# Altium footprint library SOURIAU THD.PcbLib: 34 footprints (part 4 of 5) (continued)
## SOURIAU_UT07125P21E8T [mm] "Metal Circular Connector, 5 Male Contacts, Shell Size 12, UT07 Series"
height 31.7
pads (5):
  round 1.9 hole 1.2: 1(0,0) 2(4.211,0) 3(0,-4.211) 4(-4.211,0) 5(0,4.211)
Top Overlay:
  circle w0.2: c0,0 r14.835
  circle w0.2: c0,0 r13.029
  circle w0.2: c0,0 r9.479
  circle w0.2: c0,0 r6.677
  circle w0.2: c0,0 r1.65
  circle w0.2: c4.211,0 r1.65
  circle w0.2: c0,-4.211 r1.65
  circle w0.2: c-4.211,0 r1.65
  circle w0.2: c0,4.211 r1.65
  lines w0.2: -4.39,-6.393 ccw(c0,0) 3.807,-6.756 4.372,-7.574 ccw(c0,0) 5.598,-6.719 5.035,-5.889 ; -4.387,-6.389 -5.017,-7.163 cw(c0,0) -6.17,-6.197 -5.528,-5.438 cw(c0,0) -7.267,-2.707 -8.226,-2.969 cw(c0,0) -8.611,-1.527 -7.651,-1.265 cw(c0,0) -1.619,7.584 ; -3.887,-1.618 ccw(c0,0) -1.618,-3.887 ; -3.887,1.618 cw(c0,0) -1.618,3.887 ; -1.619,7.567 -1.619,8.594 cw(c0,0) 1.59,8.599 1.59,7.567 ; -1.001,-9.426 -1.001,-10.865 1.001,-10.865 1.001,-9.426 ; 1.59,7.59 cw(c0,0) 7.755,0.058 ; 1.618,-3.887 ccw(c0,0) 3.887,-1.618 ; 1.65,0 2.561,0 ; 5.039,-5.895 ccw(c0,0) 7.625,-1.416 ; 7.597,-1.413 8.615,-1.501 ccw(c0,0) 8.745,-0.029 7.744,0.059 ; 7.655,5.59 8.894,6.302 9.893,4.564 8.66,3.855 ; -9.921,4.563 -8.666,3.841 -9.921,4.563 ; -9.921,4.563 -8.922,6.301 ; -8.922,6.301 -7.664,5.578 -8.922,6.301 ; -15.9,-7.284 ccw(c0,0) -7.284,-15.9 7.284,-15.9 ccw(c0,0) 15.9,-7.284 15.9,7.284 ccw(c0,0) 7.284,15.9 -7.284,15.9 ccw(c0,0) -15.9,7.284 -15.9,-7.284 ; -13.014,-5.222 ccw(c0,0) -11.049,-8.635 -1.977,-13.883 ccw(c0,0) 1.977,-13.883 11.049,-8.635 ccw(c0,0) 13.014,-5.222 13.014,5.222 ccw(c0,0) 11.049,8.635 1.977,13.883 ccw(c0,0) -1.977,13.883 -11.049,8.635 ccw(c0,0) -13.014,5.222 -13.014,-5.222 ; -5.774,9.481 ccw(c0,0) 5.774,9.481 -5.774,9.481
  text "B5M" at -1.456,10.666 h1.25
  text "1" at 1.789,1.324 h1.2
  text "5" at -3.167,4.099 h1.2
  text "3" at -3.336,-5.226 h1.2
Mechanical 8:
  lines w0.1: -5.211,0 -4.211,0 ; -4.211,-1 -4.211,0 ; -4.211,1 -4.211,0 ; -3.211,0 -4.211,0 ; -1,-4.211 0,-4.211 ; -1,0 0,0 ; -1,4.211 0,4.211 ; 0,-5.211 0,-4.211 ; 0,-3.211 0,-4.211 ; 0,-1 0,0 ; 0,1 0,0 ; 0,3.211 0,4.211 ; 0,5.211 0,4.211 ; 1,-4.211 0,-4.211 ; 1,0 0,0 ; 1,4.211 0,4.211 ; 3.211,0 4.211,0 ; 4.211,-1 4.211,0 ; 4.211,1 4.211,0 ; 5.211,0 4.211,0
Mechanical 14:
  circle w0.1: c0,0 r14.835
  circle w0.1: c0,0 r13.029
  circle w0.1: c0,0 r9.479
  circle w0.1: c0,0 r6.677
  circle w0.1: c0,0 r1.65
  circle w0.1: c4.211,0 r1.65
  circle w0.1: c0,-4.211 r1.65
  circle w0.1: c-4.211,0 r1.65
  circle w0.1: c0,4.211 r1.65
  lines w0.1: -4.39,-6.393 ccw(c0,0) 3.807,-6.756 4.372,-7.574 ccw(c0,0) 5.598,-6.719 5.035,-5.889 ; -4.387,-6.389 -5.017,-7.163 cw(c0,0) -6.17,-6.197 -5.528,-5.438 cw(c0,0) -7.267,-2.707 -8.226,-2.969 cw(c0,0) -8.611,-1.527 -7.651,-1.265 cw(c0,0) -1.619,7.584 ; -3.887,-1.618 ccw(c0,0) -1.618,-3.887 ; -3.887,1.618 cw(c0,0) -1.618,3.887 ; -1.619,7.567 -1.619,8.594 cw(c0,0) 1.59,8.599 1.59,7.567 ; -1.001,-9.426 -1.001,-10.865 1.001,-10.865 1.001,-9.426 ; 1.59,7.59 cw(c0,0) 7.755,0.058 ; 1.618,-3.887 ccw(c0,0) 3.887,-1.618 ; 1.65,0 2.561,0 ; 5.039,-5.895 ccw(c0,0) 7.625,-1.416 ; 7.597,-1.413 8.615,-1.501 ccw(c0,0) 8.745,-0.029 7.744,0.059 ; 7.655,5.59 8.894,6.302 9.893,4.564 8.66,3.855 ; -9.921,4.563 -8.666,3.841 -9.921,4.563 ; -9.921,4.563 -8.922,6.301 ; -8.922,6.301 -7.664,5.578 -8.922,6.301 ; -15.9,-7.284 ccw(c0,0) -7.284,-15.9 7.284,-15.9 ccw(c0,0) 15.9,-7.284 15.9,7.284 ccw(c0,0) 7.284,15.9 -7.284,15.9 ccw(c0,0) -15.9,7.284 -15.9,-7.284 ; -13.014,-5.222 ccw(c0,0) -11.049,-8.635 -1.977,-13.883 ccw(c0,0) 1.977,-13.883 11.049,-8.635 ccw(c0,0) 13.014,-5.222 13.014,5.222 ccw(c0,0) 11.049,8.635 1.977,13.883 ccw(c0,0) -1.977,13.883 -11.049,8.635 ccw(c0,0) -13.014,5.222 -13.014,-5.222 ; -5.774,9.481 ccw(c0,0) 5.774,9.481 -5.774,9.481
  text "B5M" at -1.456,10.666 h1.25
  text "1" at 1.789,1.324 h1.2
  text "5" at -3.167,4.099 h1.2
  text "3" at -3.336,-5.226 h1.2
3D body "SOURIAU_UT07125P21E8T.stp": height 31.35, standoff -3.6, extent -15.875,-15.875 15.875,15.875
3D body "SOURIAU_UT07125P21E8T_NUT.stp": height 19.35, standoff 15.92, extent -13,-14 13,14

## SOURIAU_UT07125S21E84T [mm] "Metal Circular Connector, 5 Female Contacts, Shell Size 12, UT07 Series"
height 31.7
pads (5):
  round 1.9 hole 1.2: 1(0,0) 2(-4.211,0) 3(0,-4.211) 4(4.211,0) 5(0,4.211)
Top Overlay:
  circle w0.2: c0,0 r14.835
  circle w0.2: c0,0 r13.029
  circle w0.2: c0,0 r9.479
  circle w0.2: c0,0 r6.677
  circle w0.2: c0,0 r1.65
  circle w0.2: c4.211,0 r1.65
  circle w0.2: c0,-4.211 r1.65
  circle w0.2: c-4.211,0 r1.65
  circle w0.2: c0,4.211 r1.65
  lines w0.2: -4.39,-6.393 ccw(c0,0) 3.807,-6.756 4.372,-7.574 ccw(c0,0) 5.598,-6.719 5.035,-5.889 ; -4.387,-6.389 -5.017,-7.163 cw(c0,0) -6.17,-6.197 -5.528,-5.438 cw(c0,0) -7.267,-2.707 -8.226,-2.969 cw(c0,0) -8.611,-1.527 -7.651,-1.265 cw(c0,0) -1.619,7.584 ; -3.887,-1.618 ccw(c0,0) -1.618,-3.887 ; -2.561,0 -1.65,0 ; -1.619,7.567 -1.619,8.594 cw(c0,0) 1.59,8.599 1.59,7.567 ; -1.001,-9.426 -1.001,-10.865 1.001,-10.865 1.001,-9.426 ; 1.59,7.59 cw(c0,0) 7.755,0.058 ; 1.618,-3.887 ccw(c0,0) 3.887,-1.618 ; 1.618,3.887 cw(c0,0) 3.887,1.618 ; 5.039,-5.895 ccw(c0,0) 7.625,-1.416 ; 7.597,-1.413 8.615,-1.501 ccw(c0,0) 8.745,-0.029 7.744,0.059 ; 7.655,5.59 8.894,6.302 9.893,4.564 8.66,3.855 ; -9.921,4.563 -8.666,3.841 -9.921,4.563 ; -9.921,4.563 -8.922,6.301 ; -8.922,6.301 -7.664,5.578 -8.922,6.301 ; -15.9,-7.284 ccw(c0,0) -7.284,-15.9 7.284,-15.9 ccw(c0,0) 15.9,-7.284 15.9,7.284 ccw(c0,0) 7.284,15.9 -7.284,15.9 ccw(c0,0) -15.9,7.284 -15.9,-7.284 ; -13.014,-5.222 ccw(c0,0) -11.049,-8.635 -1.977,-13.883 ccw(c0,0) 1.977,-13.883 11.049,-8.635 ccw(c0,0) 13.014,-5.222 13.014,5.222 ccw(c0,0) 11.049,8.635 1.977,13.883 ccw(c0,0) -1.977,13.883 -11.049,8.635 ccw(c0,0) -13.014,5.222 -13.014,-5.222 ; -5.774,9.481 ccw(c0,0) 5.774,9.481 -5.774,9.481
  text "B5F" at -1.456,10.666 h1.25
  text "1" at 1.789,1.324 h1.2
  text "5" at -3.167,4.099 h1.2
  text "3" at -3.336,-5.226 h1.2
Mechanical 8:
  lines w0.1: -5.211,0 -4.211,0 ; -4.211,-1 -4.211,0 ; -4.211,1 -4.211,0 ; -3.211,0 -4.211,0 ; -1,-4.211 0,-4.211 ; -1,0 0,0 ; -1,4.211 0,4.211 ; 0,-5.211 0,-4.211 ; 0,-3.211 0,-4.211 ; 0,-1 0,0 ; 0,1 0,0 ; 0,3.211 0,4.211 ; 0,5.211 0,4.211 ; 1,-4.211 0,-4.211 ; 1,0 0,0 ; 1,4.211 0,4.211 ; 3.211,0 4.211,0 ; 4.211,-1 4.211,0 ; 4.211,1 4.211,0 ; 5.211,0 4.211,0
Mechanical 14:
  circle w0.1: c0,0 r14.835
  circle w0.1: c0,0 r13.029
  circle w0.1: c0,0 r9.479
  circle w0.1: c0,0 r6.677
  circle w0.1: c0,0 r1.65
  circle w0.1: c4.211,0 r1.65
  circle w0.1: c0,-4.211 r1.65
  circle w0.1: c-4.211,0 r1.65
  circle w0.1: c0,4.211 r1.65
  lines w0.1: -4.39,-6.393 ccw(c0,0) 3.807,-6.756 4.372,-7.574 ccw(c0,0) 5.598,-6.719 5.035,-5.889 ; -4.387,-6.389 -5.017,-7.163 cw(c0,0) -6.17,-6.197 -5.528,-5.438 cw(c0,0) -7.267,-2.707 -8.226,-2.969 cw(c0,0) -8.611,-1.527 -7.651,-1.265 cw(c0,0) -1.619,7.584 ; -3.887,-1.618 ccw(c0,0) -1.618,-3.887 ; -2.561,0 -1.65,0 ; -1.619,7.567 -1.619,8.594 cw(c0,0) 1.59,8.599 1.59,7.567 ; -1.001,-9.426 -1.001,-10.865 1.001,-10.865 1.001,-9.426 ; 1.59,7.59 cw(c0,0) 7.755,0.058 ; 1.618,-3.887 ccw(c0,0) 3.887,-1.618 ; 1.618,3.887 cw(c0,0) 3.887,1.618 ; 5.039,-5.895 ccw(c0,0) 7.625,-1.416 ; 7.597,-1.413 8.615,-1.501 ccw(c0,0) 8.745,-0.029 7.744,0.059 ; 7.655,5.59 8.894,6.302 9.893,4.564 8.66,3.855 ; -9.921,4.563 -8.666,3.841 -9.921,4.563 ; -9.921,4.563 -8.922,6.301 ; -8.922,6.301 -7.664,5.578 -8.922,6.301 ; -15.9,-7.284 ccw(c0,0) -7.284,-15.9 7.284,-15.9 ccw(c0,0) 15.9,-7.284 15.9,7.284 ccw(c0,0) 7.284,15.9 -7.284,15.9 ccw(c0,0) -15.9,7.284 -15.9,-7.284 ; -13.014,-5.222 ccw(c0,0) -11.049,-8.635 -1.977,-13.883 ccw(c0,0) 1.977,-13.883 11.049,-8.635 ccw(c0,0) 13.014,-5.222 13.014,5.222 ccw(c0,0) 11.049,8.635 1.977,13.883 ccw(c0,0) -1.977,13.883 -11.049,8.635 ccw(c0,0) -13.014,5.222 -13.014,-5.222 ; -5.774,9.481 ccw(c0,0) 5.774,9.481 -5.774,9.481
  text "B5F" at -1.456,10.666 h1.2
  text "1" at 1.789,1.324 h1.2
  text "5" at -3.167,4.099 h1.2
  text "3" at -3.336,-5.226 h1.2
3D body "SOURIAU_UT07125S21E84T.stp": height 23.75, standoff -3.6, extent -15.875,-15.875 15.875,15.875
3D body "SOURIAU_UT07125S21E84T_NUT.stp": height 11.75, standoff 8.32, extent -13,-14 13,14

## SOURIAU_UT07128P21E8T [mm] "Metal Circular Connector, 8 Male Contacts, Shell Size 12, UT07 Series"
height 31.7
pads (8):
  round 1.9 hole 1.2: 1(0,0) 2(4.476,0.913) 3(3.474,-2.827) 4(0,-4.505) 5(-3.445,-2.827) 6(-4.446,0.913) 7(-2.002,4.034) 8(2.002,4.034)
Top Overlay:
  circle w0.2: c2.002,4.034 r1.65
  circle w0.2: c-3.445,-2.827 r1.65
  circle w0.2: c0,0 r1.65
  circle w0.2: c0,0 r6.69
  circle w0.2: c0,0 r9.519
  circle w0.2: c0,0 r13.024
  circle w0.2: c0,0 r14.837
  lines w0.2: -13.065,-5.071 ccw(c0,0) -10.97,-8.721 ; -13.065,5.071 cw(c0,0) -10.959,8.735 ; -13.014,-5.06 -13.014,5.082 ; -10.92,-8.71 -2.04,-13.847 ; -10.909,8.746 -2.057,13.866 ; -8.684,3.898 -9.893,4.593 -8.892,6.301 -7.69,5.61 ; -5.706,9.5 ccw(c0,0) 5.706,9.5 ; -5.655,9.511 5.756,9.511 ; -4.454,-0.748 ccw(c0,0) -4.296,-1.395 ; -3.821,2.407 cw(c0,0) -3.361,3.017 ; -2.248,-3.917 ccw(c0,0) -1.669,-4.197 ; -2.108,13.855 cw(c0,0) 1.973,13.875 ; -2.09,-13.858 ccw(c0,0) 1.956,-13.877 ; -1.001,-9.466 -1.001,-10.865 1.001,-10.865 1.001,-9.466 ; -0.47,4.492 cw(c0,0) 0.373,4.501 ; 1.575,-4.233 ccw(c0,0) 2.2,-3.944 ; 1.617,0.33 2.859,0.583 ; 2.006,-13.866 11.08,-8.635 ; 2.023,13.886 11.069,8.67 ; 4.284,-1.429 ccw(c0,0) 4.454,-0.748 ; 7.699,5.598 8.922,6.301 9.923,4.593 8.69,3.885 ; 11.019,8.659 cw(c0,0) 12.994,5.25 ; 11.03,-8.646 ccw(c0,0) 12.994,-5.25 ; 13.044,-5.239 13.044,5.261 ; -15.9,-7.273 ccw(c0,0) -7.273,-15.9 7.273,-15.9 ccw(c0,0) 15.9,-7.273 15.9,7.273 ccw(c0,0) 7.273,15.9 ; -15.9,-7.273 -15.9,7.273 ; -15.9,-7.273 -15.9,7.273 ; -15.9,7.273 cw(c0,0) -7.273,15.9 ; -7.273,15.9 7.273,15.9 ; -7.273,15.9 7.273,15.9 ; -8.65,-1.516 ccw(c0,0) -8.258,-2.986 -7.272,-2.717 ccw(c0,0) -5.547,-5.431 -6.207,-6.212 ccw(c0,0) -5.056,-7.18 -4.392,-6.401 ccw(c0,0) 3.833,-6.75 4.428,-7.583 ccw(c0,0) 5.65,-6.723 5.075,-5.874 ccw(c0,0) 7.633,-1.414 8.652,-1.504 ccw(c0,0) 8.782,-0.001 7.762,0.089 ccw(c0,0) 1.619,7.592 1.619,8.631 ccw(c0,0) -1.59,8.636 -1.59,7.598 ccw(c0,0) -7.662,-1.246 -8.65,-1.516
  text "B8M" at -1.456,10.666 h1.2
  text "5" at -6.094,-1.432 h1.2
  text "8" at -0.74,4.982 h1.2
  text "1" at -0.584,2.182 h1.2
Mechanical 8:
  lines w0.1: -5.446,0.913 -4.446,0.913 ; -4.446,-0.087 -4.446,0.913 ; -4.446,1.913 -4.446,0.913 ; -4.445,-2.827 -3.445,-2.827 ; -3.445,-3.827 -3.445,-2.827 ; -3.445,-1.827 -3.445,-2.827 ; -3.446,0.913 -4.446,0.913 ; -3.002,4.034 -2.002,4.034 ; -2.445,-2.827 -3.445,-2.827 ; -2.002,3.034 -2.002,4.034 ; -2.002,5.034 -2.002,4.034 ; -1.002,4.034 -2.002,4.034 ; -1,-4.505 0,-4.505 ; -1,0 0,0 ; 0,-5.505 0,-4.505 ; 0,-3.505 0,-4.505 ; 0,-1 0,0 ; 0,1 0,0 ; 1,-4.505 0,-4.505 ; 1,0 0,0 ; 1.002,4.034 2.002,4.034 ; 2.002,3.034 2.002,4.034 ; 2.002,5.034 2.002,4.034 ; 2.474,-2.827 3.474,-2.827 ; 3.002,4.034 2.002,4.034 ; 3.474,-3.827 3.474,-2.827 ; 3.474,-1.827 3.474,-2.827 ; 3.476,0.913 4.476,0.913 ; 4.474,-2.827 3.474,-2.827 ; 4.476,-0.087 4.476,0.913 ; 4.476,1.913 4.476,0.913 ; 5.476,0.913 4.476,0.913
Mechanical 14:
  circle w0.1: c0,0 r14.837
  circle w0.1: c0,0 r13.024
  circle w0.1: c0,0 r9.519
  circle w0.1: c0,0 r6.69
  circle w0.1: c0,0 r1.65
  circle w0.1: c-3.445,-2.827 r1.65
  circle w0.1: c2.002,4.034 r1.65
  lines w0.1: -13.065,-5.071 ccw(c0,0) -10.97,-8.721 ; -13.065,5.071 cw(c0,0) -10.959,8.735 ; -13.014,-5.06 -13.014,5.082 ; -10.92,-8.71 -2.04,-13.847 ; -10.909,8.746 -2.057,13.866 ; -8.684,3.898 -9.893,4.593 -8.892,6.301 -7.69,5.61 ; -5.706,9.5 ccw(c0,0) 5.706,9.5 ; -5.655,9.511 5.756,9.511 ; -4.454,-0.748 ccw(c0,0) -4.296,-1.395 ; -3.821,2.407 cw(c0,0) -3.361,3.017 ; -2.248,-3.917 ccw(c0,0) -1.669,-4.197 ; -2.108,13.855 cw(c0,0) 1.973,13.875 ; -2.09,-13.858 ccw(c0,0) 1.956,-13.877 ; -1.001,-9.466 -1.001,-10.865 1.001,-10.865 1.001,-9.466 ; -0.47,4.492 cw(c0,0) 0.373,4.501 ; 1.575,-4.233 ccw(c0,0) 2.2,-3.944 ; 1.617,0.33 2.859,0.583 ; 2.006,-13.866 11.08,-8.635 ; 2.023,13.886 11.069,8.67 ; 4.284,-1.429 ccw(c0,0) 4.454,-0.748 ; 7.699,5.598 8.922,6.301 9.923,4.593 8.69,3.885 ; 11.019,8.659 cw(c0,0) 12.994,5.25 ; 11.03,-8.646 ccw(c0,0) 12.994,-5.25 ; 13.044,-5.239 13.044,5.261 ; -15.9,-7.273 ccw(c0,0) -7.273,-15.9 7.273,-15.9 ccw(c0,0) 15.9,-7.273 15.9,7.273 ccw(c0,0) 7.273,15.9 ; -15.9,-7.273 -15.9,7.273 ; -15.9,-7.273 -15.9,7.273 ; -15.9,7.273 cw(c0,0) -7.273,15.9 ; -7.273,15.9 7.273,15.9 ; -7.273,15.9 7.273,15.9 ; -8.65,-1.516 ccw(c0,0) -8.258,-2.986 -7.272,-2.717 ccw(c0,0) -5.547,-5.431 -6.207,-6.212 ccw(c0,0) -5.056,-7.18 -4.392,-6.401 ccw(c0,0) 3.833,-6.75 4.428,-7.583 ccw(c0,0) 5.65,-6.723 5.075,-5.874 ccw(c0,0) 7.633,-1.414 8.652,-1.504 ccw(c0,0) 8.782,-0.001 7.762,0.089 ccw(c0,0) 1.619,7.592 1.619,8.631 ccw(c0,0) -1.59,8.636 -1.59,7.598 ccw(c0,0) -7.662,-1.246 -8.65,-1.516
  text "B8M" at -1.456,10.666 h1.2
  text "5" at -6.121,-1.459 h1.2
  text "8" at -0.74,4.982 h1.2
  text "1" at -0.584,2.182 h1.2
3D body "SOURIAU_UT07128P21E8T_NUT.stp": height 19.35, standoff 15.92, extent -13,-14 13,14
3D body "SOURIAU_UT07128P21E8T.stp": height 31.35, standoff -3.6, extent -15.875,-15.875 15.875,15.875

## SOURIAU_UT07128S21E84T [mm] "Metal Circular Connector, 8 Male Contacts, Shell Size 12, UT07 Series"
height 31.7
pads (8):
  round 1.9 hole 1.2: 1(0,0) 2(-4.446,0.913) 3(-3.445,-2.827) 4(0,-4.505) 5(3.474,-2.827) 6(4.476,0.913) 7(2.002,4.034) 8(-2.002,4.034)
Top Overlay:
  circle w0.2: c0,0 r6.69
  circle w0.2: c0,0 r9.519
  circle w0.2: c0,0 r13.024
  circle w0.2: c0,0 r14.837
  circle w0.2: c-2.002,4.034 r1.65
  circle w0.2: c3.474,-2.827 r1.65
  circle w0.2: c0,0 r1.65
  lines w0.2: -13.065,-5.071 ccw(c0,0) -10.97,-8.721 ; -13.065,5.071 cw(c0,0) -10.959,8.735 ; -13.014,-5.06 -13.014,5.082 ; -10.92,-8.71 -2.04,-13.847 ; -10.909,8.746 -2.057,13.866 ; -8.684,3.898 -9.893,4.593 -8.892,6.301 -7.69,5.61 ; -5.706,9.5 ccw(c0,0) 5.706,9.5 ; -5.655,9.511 5.756,9.511 ; -4.418,-0.737 ccw(c0,0) -4.258,-1.391 ; -2.83,0.581 -1.616,0.332 ; -2.195,-3.904 ccw(c0,0) -1.617,-4.177 ; -2.108,13.855 cw(c0,0) 1.973,13.875 ; -2.09,-13.858 ccw(c0,0) 1.956,-13.877 ; -1.001,-9.466 -1.001,-10.865 1.001,-10.865 1.001,-9.466 ; -0.408,4.46 cw(c0,0) 0.408,4.46 ; 1.617,-4.177 ccw(c0,0) 2.215,-3.893 ; 2.006,-13.866 11.08,-8.635 ; 2.023,13.886 11.069,8.67 ; 3.306,3.022 cw(c0,0) 3.777,2.408 ; 4.262,-1.377 ccw(c0,0) 4.418,-0.736 ; 7.699,5.598 8.922,6.301 9.923,4.593 8.69,3.885 ; 11.019,8.659 cw(c0,0) 12.994,5.25 ; 11.03,-8.646 ccw(c0,0) 12.994,-5.25 ; 13.044,-5.239 13.044,5.261 ; -15.9,-7.273 ccw(c0,0) -7.273,-15.9 7.273,-15.9 ccw(c0,0) 15.9,-7.273 15.9,7.273 ccw(c0,0) 7.273,15.9 ; -15.9,-7.273 -15.9,7.273 ; -15.9,-7.273 -15.9,7.273 ; -15.9,7.273 cw(c0,0) -7.273,15.9 ; -7.273,15.9 7.273,15.9 ; -7.273,15.9 7.273,15.9 ; -3.327,4.976 -3.239,5.094 ; -3.327,4.976 -3.239,5.094 ; -3.327,4.976 -3.239,5.094 ; -8.65,-1.516 ccw(c0,0) -8.258,-2.986 -7.272,-2.717 ccw(c0,0) -5.547,-5.431 -6.207,-6.212 ccw(c0,0) -5.056,-7.18 -4.392,-6.401 ccw(c0,0) 3.833,-6.75 4.428,-7.583 ccw(c0,0) 5.65,-6.723 5.075,-5.874 ccw(c0,0) 7.633,-1.414 8.652,-1.504 ccw(c0,0) 8.782,-0.001 7.762,0.089 ccw(c0,0) 1.619,7.592 1.619,8.631 ccw(c0,0) -1.59,8.636 -1.59,7.598 ccw(c0,0) -7.662,-1.246 -8.65,-1.516 ; -0.618,4.947 -0.501,4.711 -0.618,4.947
  text "B8F" at -1.456,10.666 h1.2
  text "5" at 5.184,-1.557 h1.2
  text "8" at 0.012,4.917 h1.2
  text "1" at 2.039,0.962 h1.2
Mechanical 8:
  lines w0.1: -5.446,0.913 -4.446,0.913 ; -4.446,-0.087 -4.446,0.913 ; -4.446,1.913 -4.446,0.913 ; -4.445,-2.827 -3.445,-2.827 ; -3.445,-3.827 -3.445,-2.827 ; -3.445,-1.827 -3.445,-2.827 ; -3.446,0.913 -4.446,0.913 ; -3.002,4.034 -2.002,4.034 ; -2.445,-2.827 -3.445,-2.827 ; -2.002,3.034 -2.002,4.034 ; -2.002,5.034 -2.002,4.034 ; -1.002,4.034 -2.002,4.034 ; -1,-4.505 0,-4.505 ; 0,-5.505 0,-4.505 ; 0,-3.505 0,-4.505 ; 0,1 0,0 ; 1,-4.505 0,-4.505 ; 1,0 0,0 ; 1.002,4.034 2.002,4.034 ; 2.002,3.034 2.002,4.034 ; 2.002,5.034 2.002,4.034 ; 2.474,-2.827 3.474,-2.827 ; 3.002,4.034 2.002,4.034 ; 3.474,-3.827 3.474,-2.827 ; 3.474,-1.827 3.474,-2.827 ; 3.476,0.913 4.476,0.913 ; 4.474,-2.827 3.474,-2.827 ; 4.476,-0.087 4.476,0.913 ; 4.476,1.913 4.476,0.913 ; 5.476,0.913 4.476,0.913 ; 0,0 0,-1 0,0 ; 0,0 -1,0 0,0
Mechanical 14:
  circle w0.1: c0,0 r14.837
  circle w0.1: c0,0 r13.024
  circle w0.1: c0,0 r9.519
  circle w0.1: c0,0 r6.69
  circle w0.1: c-2.002,4.034 r1.65
  circle w0.1: c3.474,-2.827 r1.65
  circle w0.1: c0,0 r1.65
  lines w0.1: -13.065,-5.071 ccw(c0,0) -10.97,-8.721 ; -13.065,5.071 cw(c0,0) -10.959,8.735 ; -13.014,-5.06 -13.014,5.082 ; -10.92,-8.71 -2.04,-13.847 ; -10.909,8.746 -2.057,13.866 ; -8.684,3.898 -9.893,4.593 -8.892,6.301 -7.69,5.61 ; -5.706,9.5 ccw(c0,0) 5.706,9.5 ; -5.655,9.511 5.756,9.511 ; -4.418,-0.737 ccw(c0,0) -4.258,-1.391 ; -2.83,0.581 -1.616,0.332 ; -2.195,-3.904 ccw(c0,0) -1.617,-4.177 ; -2.108,13.855 cw(c0,0) 1.973,13.875 ; -2.09,-13.858 ccw(c0,0) 1.956,-13.877 ; -1.001,-9.466 -1.001,-10.865 1.001,-10.865 1.001,-9.466 ; -0.408,4.46 cw(c0,0) 0.408,4.46 ; 1.617,-4.177 ccw(c0,0) 2.215,-3.893 ; 2.006,-13.866 11.08,-8.635 ; 2.023,13.886 11.069,8.67 ; 3.306,3.022 cw(c0,0) 3.777,2.408 ; 4.262,-1.377 ccw(c0,0) 4.418,-0.736 ; 7.699,5.598 8.922,6.301 9.923,4.593 8.69,3.885 ; 11.019,8.659 cw(c0,0) 12.994,5.25 ; 11.03,-8.646 ccw(c0,0) 12.994,-5.25 ; 13.044,-5.239 13.044,5.261 ; -15.9,-7.273 ccw(c0,0) -7.273,-15.9 7.273,-15.9 ccw(c0,0) 15.9,-7.273 15.9,7.273 ccw(c0,0) 7.273,15.9 ; -15.9,-7.273 -15.9,7.273 ; -15.9,-7.273 -15.9,7.273 ; -15.9,7.273 cw(c0,0) -7.273,15.9 ; -7.273,15.9 7.273,15.9 ; -7.273,15.9 7.273,15.9 ; -3.327,4.976 -3.239,5.094 ; -3.327,4.976 -3.239,5.094 ; -3.327,4.976 -3.239,5.094 ; -8.65,-1.516 ccw(c0,0) -8.258,-2.986 -7.272,-2.717 ccw(c0,0) -5.547,-5.431 -6.207,-6.212 ccw(c0,0) -5.056,-7.18 -4.392,-6.401 ccw(c0,0) 3.833,-6.75 4.428,-7.583 ccw(c0,0) 5.65,-6.723 5.075,-5.874 ccw(c0,0) 7.633,-1.414 8.652,-1.504 ccw(c0,0) 8.782,-0.001 7.762,0.089 ccw(c0,0) 1.619,7.592 1.619,8.631 ccw(c0,0) -1.59,8.636 -1.59,7.598 ccw(c0,0) -7.662,-1.246 -8.65,-1.516 ; -0.618,4.947 -0.501,4.711 -0.618,4.947
  text "B8F" at -1.456,10.666 h1.2
  text "5" at 5.184,-1.557 h1.2
  text "8" at 0.012,4.917 h1.2
  text "1" at 2.039,0.962 h1.2
3D body "SOURIAU_UT07128S21E84T.stp": height 23.75, standoff -3.6, extent -15.875,-15.875 15.875,15.875
3D body "SOURIAU_UT07128S21E84T_NUT.stp": height 11.75, standoff 8.32, extent -13,-14 13,14

## SOURIAU_UT071412P21E8T [mm] "Metal Circular Connector, 12 Male Contacts, Shell Size 14, UT07 Series"
height 31.7
pads (12):
  round 1.9 hole 1.2: 1(1.478,1.762) 2(0.787,-2.161) 3(-2.265,0.399) 4(-5.153,2.975) 5(-2.035,5.591) 6(2.035,5.591) 7(5.153,2.975) 8(5.86,-1.033) 9(3.825,-4.558) 10(0,-5.95) 11(-3.825,-4.558) 12(-5.86,-1.033)
Top Overlay:
  circle w0.2: c0,0 r15
  circle w0.2: c0,0 r16.45
  circle w0.2: c0,0 r11.1
  lines w0.2: -10.074,4.661 -11.412,5.434 -10.412,7.166 -9.074,6.393 ; -7.485,-1.32 ccw(c-5.86,-1.033) -6.146,0.592 ; -5.035,-2.462 -4.65,-3.129 ; -3.921,1.877 -3.496,1.498 ; -3.889,4.036 -3.299,4.531 ; -3.53,6.288 ccw(c-2.035,5.591) -1.338,7.087 ; -2.274,-5.122 -1.55,-5.386 ; -1.167,-7.117 cw(c0,-5.95) 1.167,-7.117 ; -1.001,-0.661 -0.477,-1.101 ; -1,-11.055 -1,-12.6 1,-12.6 1,-11.055 ; -0.385,5.591 0.385,5.591 ; -0.172,1.772 ccw(c1.478,1.762) 1.454,3.412 ; 1.073,-0.536 1.192,0.137 ; 1.55,-5.386 2.274,-5.122 ; 3.299,4.531 3.889,4.036 ; 4.65,-3.129 5.035,-2.462 ; 5.439,1.35 5.573,0.592 ; 9.074,6.393 10.412,7.166 11.412,5.434 10.074,4.661 ; -17.45,-7.766 ccw(c0,0) -7.766,-17.45 7.766,-17.45 ccw(c0,0) 17.45,-7.766 17.45,7.766 ccw(c0,0) 7.766,17.45 -7.766,17.45 ccw(c0,0) -17.45,7.766 -17.45,-7.766 ; -15,-5.71 ccw(c0,0) -12.445,-10.135 -2.555,-15.845 ccw(c0,0) 2.555,-15.845 12.445,-10.135 ccw(c0,0) 15,-5.71 15,5.71 ccw(c0,0) 12.445,10.135 2.555,15.845 ccw(c0,0) -2.555,15.845 -12.445,10.135 ccw(c0,0) -15,5.71 -15,-5.71 ; -10.184,-1.849 ccw(c0,0) -9.744,-3.491 -8.774,-3.231 ccw(c0,0) -6.636,-6.586 -7.282,-7.355 ccw(c0,0) -5.979,-8.448 -5.334,-7.679 ccw(c0,0) 4.644,-8.115 5.22,-8.937 ccw(c0,0) 6.613,-7.962 6.037,-7.14 ccw(c0,0) 9.202,-1.658 10.202,-1.746 ccw(c0,0) 10.35,-0.052 9.35,0.035 ccw(c0,0) 1.65,9.203 1.65,10.218 ccw(c0,0) -1.65,10.218 -1.65,9.203 ccw(c0,0) -9.214,-1.589 -10.184,-1.849 ; -5.793,11.195 ccw(c0,0) 5.793,11.195 -5.793,11.195
  text "1" at -0.069,2.782 h1.2
  text "5" at -3.205,6.965 h1.2
  text "10" at -0.971,-8.667 h1.2
  text "12" at -8.531,0.224 h1.2
  text "B12M" at -2.091,12.444 h1.2
Mechanical 8:
  circle w0.1: c5.153,2.975 r1.25
  circle w0.1: c2.035,5.591 r1.25
  circle w0.1: c-2.035,5.591 r1.25
  circle w0.1: c-5.153,2.975 r1.25
  circle w0.1: c-5.86,-1.033 r1.25
  circle w0.1: c-3.825,-4.558 r1.25
  circle w0.1: c0,-5.95 r1.25
  circle w0.1: c3.825,-4.558 r1.25
  circle w0.1: c5.86,-1.033 r1.25
  circle w0.1: c1.478,1.762 r1.25
  circle w0.1: c0.787,-2.161 r1.25
  circle w0.1: c-2.265,0.399 r1.25
  circle w0.1: c-2.265,0.399 r1.65
  circle w0.1: c-5.153,2.975 r1.65
  circle w0.1: c-3.825,-4.558 r1.65
  circle w0.1: c3.825,-4.558 r1.65
  circle w0.1: c0.787,-2.161 r1.65
  circle w0.1: c2.035,5.591 r1.65
  circle w0.1: c5.153,2.975 r1.65
  circle w0.1: c5.86,-1.033 r1.65
  circle w0.1: c-5.86,-1.033 r1.65
  circle w0.1: c0,-5.95 r1.65
  circle w0.1: c1.478,1.762 r1.65
  circle w0.1: c-2.035,5.591 r1.65
  lines w0.1: -5.86,-2.033 -5.86,-1.033 -4.86,-1.033 ; -5.153,1.975 -5.153,2.975 -4.153,2.975 ; -3.825,-5.558 -3.825,-4.558 -2.825,-4.558 ; -2.265,-0.601 -2.265,0.399 -1.265,0.399 ; -2.035,4.591 -2.035,5.591 -1.035,5.591 ; 0,-6.95 0,-5.95 1,-5.95 ; 0,-1 0,0 1,0 ; 0.787,-3.161 0.787,-2.161 1.787,-2.161 ; 1.478,0.762 1.478,1.762 2.478,1.762 ; 2.035,4.591 2.035,5.591 3.035,5.591 ; 3.825,-5.558 3.825,-4.558 4.825,-4.558 ; 5.153,1.975 5.153,2.975 6.153,2.975 ; 5.86,-2.033 5.86,-1.033 6.86,-1.033
Mechanical 14:
  circle w0.1: c0,0 r15
  circle w0.1: c0,0 r16.45
  circle w0.1: c0,0 r11.1
  lines w0.1: -10.074,4.661 -11.412,5.434 -10.412,7.166 -9.074,6.393 ; -7.485,-1.32 ccw(c-5.86,-1.033) -6.146,0.592 ; -5.035,-2.462 -4.65,-3.129 ; -3.921,1.877 -3.496,1.498 ; -3.889,4.036 -3.299,4.531 ; -3.53,6.288 ccw(c-2.035,5.591) -1.338,7.087 ; -2.274,-5.122 -1.55,-5.386 ; -1.167,-7.117 cw(c0,-5.95) 1.167,-7.117 ; -1.001,-0.661 -0.477,-1.101 ; -1,-11.055 -1,-12.6 1,-12.6 1,-11.055 ; -0.385,5.591 0.385,5.591 ; -0.172,1.772 ccw(c1.478,1.762) 1.454,3.412 ; 1.073,-0.536 1.192,0.137 ; 1.55,-5.386 2.274,-5.122 ; 3.299,4.531 3.889,4.036 ; 4.65,-3.129 5.035,-2.462 ; 5.439,1.35 5.573,0.592 ; 9.074,6.393 10.412,7.166 11.412,5.434 10.074,4.661 ; -17.45,-7.766 ccw(c0,0) -7.766,-17.45 7.766,-17.45 ccw(c0,0) 17.45,-7.766 17.45,7.766 ccw(c0,0) 7.766,17.45 -7.766,17.45 ccw(c0,0) -17.45,7.766 -17.45,-7.766 ; -15,-5.71 ccw(c0,0) -12.445,-10.135 -2.555,-15.845 ccw(c0,0) 2.555,-15.845 12.445,-10.135 ccw(c0,0) 15,-5.71 15,5.71 ccw(c0,0) 12.445,10.135 2.555,15.845 ccw(c0,0) -2.555,15.845 -12.445,10.135 ccw(c0,0) -15,5.71 -15,-5.71 ; -10.184,-1.849 ccw(c0,0) -9.744,-3.491 -8.774,-3.231 ccw(c0,0) -6.636,-6.586 -7.282,-7.355 ccw(c0,0) -5.979,-8.448 -5.334,-7.679 ccw(c0,0) 4.644,-8.115 5.22,-8.937 ccw(c0,0) 6.613,-7.962 6.037,-7.14 ccw(c0,0) 9.202,-1.658 10.202,-1.746 ccw(c0,0) 10.35,-0.052 9.35,0.035 ccw(c0,0) 1.65,9.203 1.65,10.218 ccw(c0,0) -1.65,10.218 -1.65,9.203 ccw(c0,0) -9.214,-1.589 -10.184,-1.849 ; -5.793,11.195 ccw(c0,0) 5.793,11.195 -5.793,11.195
  text "1" at -0.069,2.782 h1.2
  text "5" at -3.205,6.965 h1.2
  text "10" at -0.971,-8.667 h1.2
  text "12" at -8.531,0.224 h1.2
  text "B12M" at -2.091,12.444 h1.2
3D body "SOURIAU_UT071412P21E8T.stp": height 31.35, standoff -3.6, extent -17.465,-17.465 17.465,17.465
3D body "SOURIAU_UT071412P21E8T_NUT.stp": height 19.35, standoff 15.92, extent -15,-16 15,16